# Altium footprint library RDM_ALT_PCB.PcbLib: 127 footprints (part 2 of 8)
Each footprint in its own frame and in the unit in brackets; x right, y up, seen from the top. Pads: shape width x height; smd on the part's side, far side on the other; paste and mask are expansions set on the pad; w line width, h text height; cw(c..) or ccw(c..) is an arc to the next point about the centre after c.
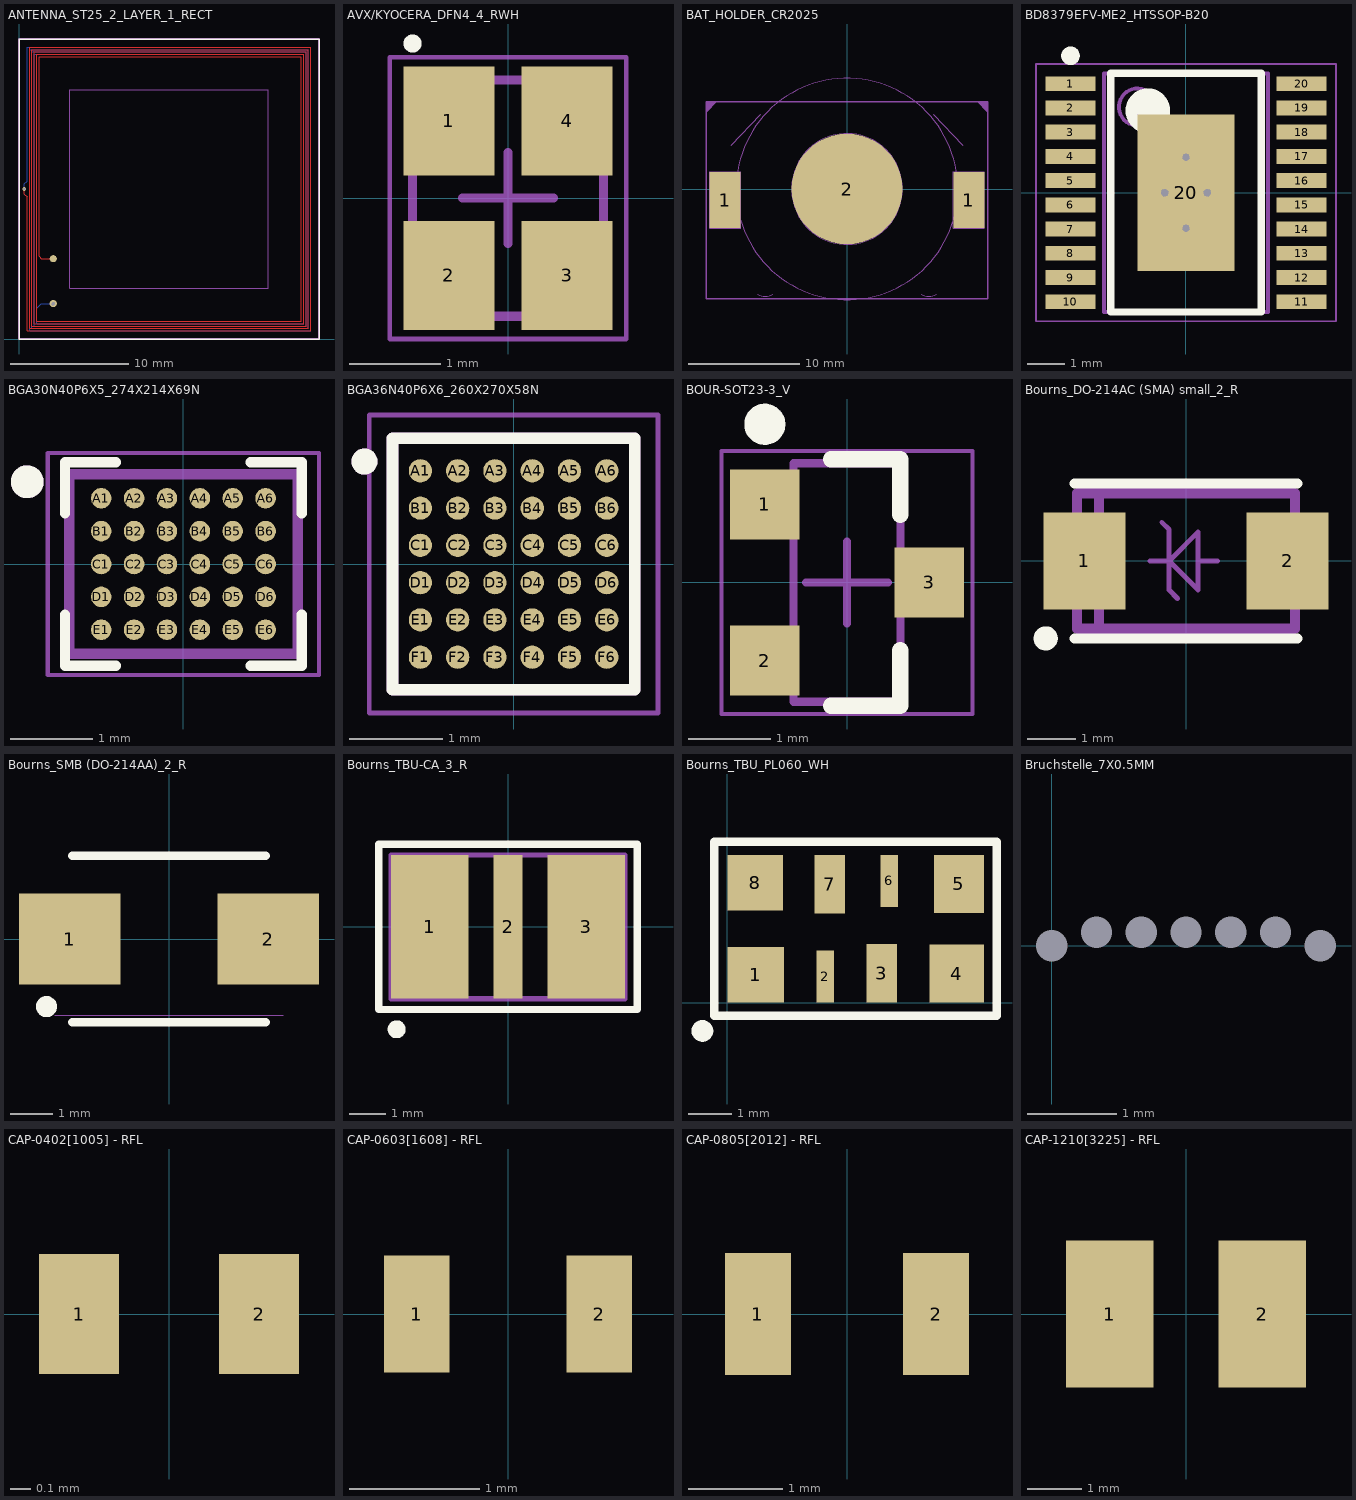
[diagram p1: the footprints below, top view; thin cyan lines are the x and y axes]

## ANTENNA_ST25_2_LAYER_1_RECT [mm] "3,56 MHZ NFC Antenna for Nordic ST25DV04K"
pads (2):
  round 0.6 smd: 1(2.9,6.8) 2(2.9,3)
via 0.457,12.7 diameter 0.3 hole 0.2
via 2.9,3 diameter 0.6 hole 0.3
Top Layer:
  lines w0.1: 0.457,12.7 0.457,12.268 0.698,12.027 0.698,0.7 24.7,0.7 24.7,24.7 0.9,24.7 0.9,0.9 24.5,0.9 24.5,24.5 1.1,24.5 1.1,1.1 24.3,1.1 24.3,24.3 1.3,24.3 1.3,1.3 24.1,1.3 24.1,24.1 1.5,24.1 1.5,1.5 23.9,1.5 23.9,23.9 1.7,23.9 1.7,7 1.9,6.8 2.9,6.8
Bottom Layer:
  lines w0.1: 0.457,12.7 0.457,13.132 0.7,13.375 0.702,24.7 24.7,24.7 24.7,0.7 0.9,0.7 0.9,24.5 24.5,24.5 24.5,0.9 1.1,0.9 1.1,24.3 24.3,24.3 24.3,1.1 1.3,1.1 1.3,24.1 24.1,24.1 24.1,1.3 1.5,1.3 1.5,2.6 1.9,3 2.9,3
Top Overlay:
  lines w0.127: 0,0 25.4,0 25.4,25.4 0,25.4 0,0
Mechanical 15:
  lines w0.1: 0,0 25.4,0 ; 4.3,4.3 21.1,4.3 21.1,21.1 4.3,21.1 4.3,4.3
  lines w0.15: 0,0 25.4,0 25.4,25.4 0,25.4 0,0

## AVX/KYOCERA_DFN4_4_RWH [mm]
pads (4):
  rect 1x1.2 smd: 1(-0.65,0.85) 2(-0.65,-0.85) 3(0.65,-0.85) 4(0.65,0.85)
Top Overlay:
  circle w0.1: c-1.05,1.7 r0.05
Mechanical 13:
  lines w0.1: -1.05,-1.3 1.05,-1.3 1.05,1.3 -1.05,1.3 -1.05,-1.3
Mechanical 15:
  lines w0.05: -1.3,-1.55 1.3,-1.55 1.3,1.55 -1.3,1.55 -1.3,-1.55
  lines w0.1: -0.5,0 0.5,0 ; 0,-0.5 0,0.5
3D body "DFN130P200X55-4N.step": height 0.55, standoff 0, extent -1.05,-1.45 1.5,1.45

## BAT_HOLDER_CR2025 [mm] "BATTERY RETAINER COIN 20MM SMD"
pads (3):
  rect 2.79x5.08 smd: 1(-11,-1) 1(11,-1)
  round 10 smd: 2(0,0)
Mechanical 29 (Mech29):
  circle w0.1: c0,0 r10
  circle w0.1: c0,0 r5.004
  region: 11.7,7.9 12.7,6.9 12.7,7.9
  region: -12.7,6.9 -11.7,7.9 -12.7,7.9
  region: -12.7,7.25
  lines w0.1: -12.395,-3.53 -12.383,-3.542 -9.615,-3.542 -9.604,-3.531 -9.604,1.544 -9.609,1.539 -12.395,1.539 -12.395,-3.529 ; -10.439,3.937 -7.798,6.731 ; -8.049,-9.496 ccw(c-7.38,-8.497) -6.709,-9.494 ; -1.06,-1.063 1.06,1.059 ; -1.06,1.058 1.061,-1.063 ; 6.711,-9.496 ccw(c7.38,-8.497) 8.051,-9.494 ; 7.798,6.756 10.465,3.937 ; 9.6,-3.524 9.612,-3.536 12.38,-3.536 12.391,-3.525 12.391,1.55 12.386,1.545 9.6,1.545 9.6,-3.523
  lines w0.127: -12.7,-9.89 12.7,-9.89 ; -12.7,-9.89 12.7,-9.89 ; -12.7,-9.89 -12.7,7.89 ; -12.7,-9.89 -12.7,7.89 ; -12.7,7.89 12.7,7.89 ; -12.7,7.89 12.7,7.89 ; 12.7,-9.89 12.7,7.89 ; 12.7,-9.89 12.7,7.89
3D body "User Library-keystone-PN3034.STEP": height 4.08, standoff 0.01, extent -11.621,-9.725 11.621,6.754
3D body: height 2.45, standoff 0, extent -10,-10 10,10

## BD8379EFV-ME2_HTSSOP-B20 [mm] "TSOP, 20-Leads, Body 6.40x4.40mm, Pitch 0.65mm, IPC Medium Density"
height 1.5
pads (21):
  rect 1.35x0.4 smd: 1(-3.1,2.925) 2(-3.1,2.275) 3(-3.1,1.625) 4(-3.1,0.975) 5(-3.1,0.325) 6(-3.1,-0.325) 7(-3.1,-0.975) 8(-3.1,-1.625) 9(-3.1,-2.275) 10(-3.1,-2.925) 11(3.1,-2.925) 12(3.1,-2.275) 13(3.1,-1.625) 14(3.1,-0.975) 15(3.1,-0.325) 16(3.1,0.325) 17(3.1,0.975) 18(3.1,1.625) 19(3.1,2.275) 20(3.1,2.925)
  rect 2.6x4.2 smd: 20(0,0)
via -0.575,0 diameter 0.3 hole 0.2
via 0,-0.95 diameter 0.3 hole 0.2
via 0,0.95 diameter 0.3 hole 0.2
via 0.575,0 diameter 0.3 hole 0.2
Top Overlay:
  circle w0.25: c-3.1,3.675 r0.125
  circle w0.6: c-1.025,2.2 r0.3
  lines w0.2: -2.025,-3.2 -2.025,3.2 2.025,3.2 2.025,-3.2 -2.025,-3.2
Mechanical 13:
  circle w0.1: c-1.3,2.3 r0.5
  lines w0.1: -2.2,-3.2 -2.2,3.2 2.2,3.2 2.2,-3.2 -2.2,-3.2
Mechanical 15:
  lines w0.05: -4.025,-3.45 -4.025,3.45 4.025,3.45 4.025,-3.45 -4.025,-3.45
  lines w0.1: -0.5,0 0.5,0 ; 0,-0.5 0,0.5
3D body: height 1, standoff 0.1, extent -2.2,-3.2 2.2,3.2

## BGA30N40P6X5_274X214X69N [mm] "ST25R3912"
pads (30):
  round 0.25 smd: A1(-1,0.8) A2(-0.6,0.8) A3(-0.2,0.8) A4(0.2,0.8) A5(0.6,0.8) A6(1,0.8) B1(-1,0.4) B2(-0.6,0.4) B3(-0.2,0.4) B4(0.2,0.4) B5(0.6,0.4) B6(1,0.4) C1(-1,0) C2(-0.6,0) C3(-0.2,0) C4(0.2,0) C5(0.6,0) C6(1,0) D1(-1,-0.4) D2(-0.6,-0.4) D3(-0.2,-0.4) D4(0.2,-0.4) D5(0.6,-0.4) D6(1,-0.4) E1(-1,-0.8) E2(-0.6,-0.8) E3(-0.2,-0.8) E4(0.2,-0.8) E5(0.6,-0.8) E6(1,-0.8)
Top Overlay:
  circle w0.2: c-1.9,1 r0.1
  lines w0.127: -1.44,-0.62 -1.44,-1.24 -0.82,-1.24 ; -1.44,0.62 -1.44,1.24 -0.82,1.24 ; 0.82,-1.24 1.44,-1.24 1.44,-0.62 ; 0.82,1.24 1.44,1.24 1.44,0.62
Mechanical 4:
  circle w0.2: c-1.9,1 r0.1
  circle w0.2: c-1.9,1 r0.1
  lines w0.127: -1.39,-1.09 -1.39,1.09 ; -1.39,-1.09 1.39,-1.09 ; -1.39,-1.09 -1.39,1.09 ; -1.39,-1.09 1.39,-1.09 ; -1.39,1.09 1.39,1.09 ; -1.39,1.09 1.39,1.09 ; 1.39,-1.09 1.39,1.09 ; 1.39,-1.09 1.39,1.09
Mechanical 16:
  lines w0.05: -1.65,-1.35 -1.65,1.35 1.65,1.35 1.65,-1.35 -1.65,-1.35

## BGA36N40P6X6_260X270X58N [mm] "MCU 32-Bit STM32 ARM Cortex M4 RISC 128KB Flash 2.5V/3.3V 36-Pin WLCSP"
pads (36):
  round 0.25 smd: A1(-1,1) A2(-0.6,1) A3(-0.2,1) A4(0.2,1) A5(0.6,1) A6(1,1) B1(-1,0.6) B2(-0.6,0.6) B3(-0.2,0.6) B4(0.2,0.6) B5(0.6,0.6) B6(1,0.6) C1(-1,0.2) C2(-0.6,0.2) C3(-0.2,0.2) C4(0.2,0.2) C5(0.6,0.2) C6(1,0.2) D1(-1,-0.2) D2(-0.6,-0.2) D3(-0.2,-0.2) D4(0.2,-0.2) D5(0.6,-0.2) D6(1,-0.2) E1(-1,-0.6) E2(-0.6,-0.6) E3(-0.2,-0.6) E4(0.2,-0.6) E5(0.6,-0.6) E6(1,-0.6) F1(-1,-1) F2(-0.6,-1) F3(-0.2,-1) F4(0.2,-1) F5(0.6,-1) F6(1,-1)
Top Overlay:
  circle w0.14: c-1.6,1.1 r0.07
  lines w0.127: -1.3,-1.35 -1.3,1.35 1.3,1.35 1.3,-1.35 -1.3,-1.35
Top Solder:
  circle w0: c1,-1 r0.175
  circle w0: c0.6,-1 r0.175
  circle w0: c0.2,-1 r0.175
  circle w0: c-0.2,-1 r0.175
  circle w0: c-0.6,-1 r0.175
  circle w0: c-1,-1 r0.175
  circle w0: c1,-0.6 r0.175
  circle w0: c0.6,-0.6 r0.175
  circle w0: c0.2,-0.6 r0.175
  circle w0: c-0.2,-0.6 r0.175
  circle w0: c-0.6,-0.6 r0.175
  circle w0: c-1,-0.6 r0.175
  circle w0: c1,-0.2 r0.175
  circle w0: c0.6,-0.2 r0.175
  circle w0: c0.2,-0.2 r0.175
  circle w0: c-0.2,-0.2 r0.175
  circle w0: c-0.6,-0.2 r0.175
  circle w0: c-1,-0.2 r0.175
  circle w0: c1,0.2 r0.175
  circle w0: c0.6,0.2 r0.175
  circle w0: c0.2,0.2 r0.175
  circle w0: c-0.2,0.2 r0.175
  circle w0: c-0.6,0.2 r0.175
  circle w0: c-1,0.2 r0.175
  circle w0: c1,0.6 r0.175
  circle w0: c0.6,0.6 r0.175
  circle w0: c0.2,0.6 r0.175
  circle w0: c-0.2,0.6 r0.175
  circle w0: c-0.6,0.6 r0.175
  circle w0: c-1,0.6 r0.175
  circle w0: c1,1 r0.175
  circle w0: c0.6,1 r0.175
  circle w0: c0.2,1 r0.175
  circle w0: c-0.2,1 r0.175
  circle w0: c-0.6,1 r0.175
  circle w0: c-1,1 r0.175
Mechanical 4:
  circle w0.14: c-1.6,1.1 r0.07
  circle w0.14: c-1.6,1.1 r0.07
  lines w0.127: -1.3,-1.35 1.3,-1.35 ; -1.3,-1.35 -1.3,1.35 ; -1.3,-1.35 1.3,-1.35 ; -1.3,-1.35 -1.3,1.35 ; -1.3,1.35 1.3,1.35 ; -1.3,1.35 1.3,1.35 ; 1.3,-1.35 1.3,1.35 ; 1.3,-1.35 1.3,1.35
Mechanical 16:
  lines w0.05: -1.55,-1.6 -1.55,1.6 1.55,1.6 1.55,-1.6 -1.55,-1.6
3D body "STM32F051T8Y6TR--3DModel-STEP-56544.STEP": height 0.42, standoff -0.16, extent -1.303,-1.402 1.302,1.301

## BOUR-SOT23-3_V [mm] "SOT23, 3-Leads, Body 2.9x1.3mm, Pitch 0.95mm"
height 1.17
pads (3):
  rect 0.85x0.85 smd: 1(-1,0.95) 2(-1,-0.95) 3(1,0)
Top Overlay:
  circle w0.25: c-1,1.925 r0.125
  lines w0.2: -0.195,-1.5 0.65,-1.5 0.65,-0.825 ; -0.195,1.5 0.65,1.5 0.65,0.825
Mechanical 13:
  lines w0.1: -0.65,-1.45 -0.65,1.45 0.65,1.45 0.65,-1.45 -0.65,-1.45
Mechanical 15:
  lines w0.05: -1.525,-1.6 -1.525,1.6 1.525,1.6 1.525,-1.6 -1.525,-1.6
  lines w0.1: -0.5,0 0.5,0 ; 0,-0.5 0,0.5
3D body: height 1.17, standoff 0.02, extent -0.65,-1.45 0.65,1.45

## Bourns_DO-214AC (SMA) small_2_R [mm] "Bourns_DO-214AC (SMA) small_2_R"
height 2.6
pads (2):
  rect 1.7x2 smd: 1(-2.1,0) 2(2.1,0)
Top Overlay:
  circle w0.25: c-2.9,-1.6 r0.125
  lines w0.21: -2.3,-1.6 2.3,-1.6 ; -2.3,1.6 2.3,1.6
Mechanical 13:
  lines w0.21: -1.8,-1.4 -1.8,1.4 ; -2.25,-1.4 2.25,-1.4 2.25,1.4 -2.25,1.4 -2.25,-1.4
Mechanical 15:
  lines w0.1: -0.75,0 -0.35,0 ; -0.5,0.8 -0.35,0.65 -0.35,0.6 -0.35,-0.6 -0.175,-0.775 ; 0.25,0 0.65,0 ; -0.35,0 0.25,-0.6 0.25,0.6 -0.35,0
3D body "DO-214AC SMA.step": height 2.4, standoff 0, extent -2.6,-1.3 2.6,1.3

## Bourns_SMB (DO-214AA)_2_R [mm] "Bourns_SMB (DO-214AA)_2_R"
height 2.4
pads (2):
  rect 2.4x2.16 smd: 1(-2.35,0) 2(2.35,0)
Top Overlay:
  circle w0.25: c-2.9,-1.6 r0.125
  lines w0.2: -2.285,-1.97 2.285,-1.97 ; -2.285,1.97 2.285,1.97
Mechanical 15:
  lines w0.01: -2.7,-1.81 2.7,-1.81
3D body "tisp4240m3bj.stp": height 2.13, standoff 0, extent -2.7,-1.81 2.7,1.81

## Bourns_TBU-CA_3_R [mm] "Bourns_TBU-CA_3_R"
height 1
pads (3):
  rect 2.15x4 smd: 1(-2.175,0) 3(2.175,0)
  rect 0.8x4 smd: 2(0,0)
Top Overlay:
  circle w0.25: c-3.1,-2.85 r0.125
  lines w0.2: -3.6,-2.3 -3.6,2.3 3.6,2.3 3.6,-2.3 -3.6,-2.3
Mechanical 13:
  lines w0.15: -3.25,-2 -3.25,2 3.25,2 3.25,-2 -3.25,-2
3D body: height 1, standoff 0, extent -3.25,-2 3.25,2

## Bourns_TBU_PL060_WH [mm] "TBU-PL060-200-WH"
height 1
pads (8):
  rect 1.3x1.275 smd: 1(0.65,0.637)
  rect 0.4x1.2 smd: 2(2.25,0.6) 6(3.725,2.8)
  rect 0.7x1.35 smd: 3(3.55,0.675) 7(2.35,2.725)
  rect 1.25x1.335 smd: 4(5.275,0.667)
  rect 1.15x1.335 smd: 5(5.325,2.732)
  rect 1.275x1.275 smd: 8(0.638,2.762)
Top Overlay:
  circle w0.25: c-0.575,-0.65 r0.125
  lines w0.2: -0.301,-0.298 6.195,-0.298 ; -0.3,-0.3 -0.3,3.7 6.195,3.7 6.195,-0.294
Mechanical 13:
  lines w0.15: -0.3,-0.3 6.2,-0.3 6.2,3.703 -0.297,3.703 ; -0.3,-0.297 -0.3,3.703
Multi-Layer:
  region: 3.774,-0.042
3D body: height 1, standoff 0, extent -0.302,-0.315 6.203,3.665

## Bruchstelle_7X0.5MM [mm] "Bruchstelle_7X0.5MM"
pads (7):
  round 0 hole 0.35 unplated paste+0 mask+0.102: 0(0,0) 0(0.5,0.15) 0(1,0.15) 0(1.5,0.15) 0(2,0.15) 0(2.5,0.15) 0(3,0)

## CAP-0402[1005] - RFL [mm] "SMD Chip 0402 - CAP - RFL"
height 0.7
pads (2):
  rect 0.4x0.6 smd: 1(-0.45,0) 2(0.45,0)
3D body "CAP0402.step": height 0.5, standoff 0, extent -0.5,-0.25 0.5,0.25

## CAP-0603[1608] - RFL [mm] "SMD Chip 0603 - CAP - RFL"
height 0.95
pads (2):
  rect 0.5x0.9 smd: 1(-0.7,0) 2(0.7,0)
3D body "CAP0603.step": height 0.8, standoff 0, extent -0.8,-0.4 0.8,0.4

## CAP-0805[2012] - RFL [mm] "SMD Chip 0805 - CAP - RFL"
height 1.4
pads (2):
  rect 0.7x1.3 smd: 1(-0.95,0) 2(0.95,0)
3D body "CAP0805.step": height 0.6, standoff 0, extent -1,-0.625 1,0.625

## CAP-1210[3225] - RFL [mm] "SMD Chip 1210  - CAP - RFL"
height 1
pads (2):
  rect 1.6x2.7 smd: 1(-1.4,0) 2(1.4,0)
3D body "CAP1210.step": height 0.84, standoff 0.06, extent -1.6,-1.25 1.6,1.25